# Altium footprint library ST封装.PcbLib: 1336 footprints (part 90 of 109)
Each footprint in its own frame and in the unit in brackets; x right, y up, seen from the top. Pads: shape width x height; smd on the part's side, far side on the other; paste and mask are expansions set on the pad; w line width, h text height; cw(c..) or ccw(c..) is an arc to the next point about the centre after c.
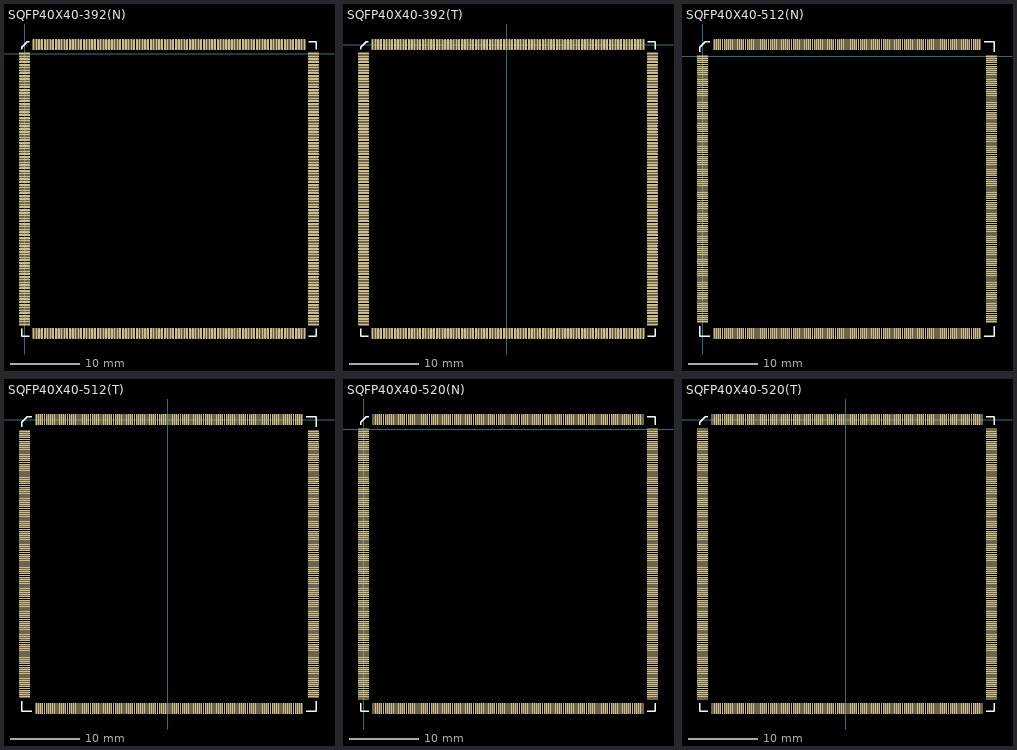
[diagram p89: the footprints below, top view; thin cyan lines are the x and y axes]

## SQFP40X40-392(N) [mm]
pads (392):
  rect 1.6x0.3 smd: 1(0,0)
  oval 1.6x0.3 smd: 2(0,-0.4) 3(0,-0.8) 4(0,-1.2) 5(0,-1.6) 6(0,-2) 7(0,-2.4) 8(0,-2.8) 9(0,-3.2) 10(0,-3.6) 11(0,-4) 12(0,-4.4) 13(0,-4.8) 14(0,-5.2) 15(0,-5.6) 16(0,-6) 17(0,-6.4) 18(0,-6.8) 19(0,-7.2) 20(0,-7.6) 21(0,-8) 22(0,-8.4) 23(0,-8.8) 24(0,-9.2) 25(0,-9.6) 26(0,-10) 27(0,-10.4) 28(0,-10.8) 29(0,-11.2) 30(0,-11.6) 31(0,-12) 32(0,-12.4) 33(0,-12.8) 34(0,-13.2) 35(0,-13.6) 36(0,-14) 37(0,-14.4) 38(0,-14.8) 39(0,-15.2) 40(0,-15.6) 41(0,-16) 42(0,-16.4) 43(0,-16.8) 44(0,-17.2) 45(0,-17.6) 46(0,-18) 47(0,-18.4) 48(0,-18.8) 49(0,-19.2) 50(0,-19.6) 51(0,-20) 52(0,-20.4) 53(0,-20.8) 54(0,-21.2) 55(0,-21.6) 56(0,-22) 57(0,-22.4) 58(0,-22.8) 59(0,-23.2) 60(0,-23.6) 61(0,-24) 62(0,-24.4) 63(0,-24.8) 64(0,-25.2) 65(0,-25.6) 66(0,-26) 67(0,-26.4) 68(0,-26.8) 69(0,-27.2) 70(0,-27.6) 71(0,-28) 72(0,-28.4) 73(0,-28.8) 74(0,-29.2) 75(0,-29.6) 76(0,-30) 77(0,-30.4) 78(0,-30.8) 79(0,-31.2) 80(0,-31.6) 81(0,-32) 82(0,-32.4) 83(0,-32.8) 84(0,-33.2) 85(0,-33.6) 86(0,-34) 87(0,-34.4) 88(0,-34.8) 89(0,-35.2) 90(0,-35.6) 91(0,-36) 92(0,-36.4) 93(0,-36.8) 94(0,-37.2) 95(0,-37.6) 96(0,-38) 97(0,-38.4) 98(0,-38.8) 197(41.4,-38.8) 198(41.4,-38.4) 199(41.4,-38) 200(41.4,-37.6) 201(41.4,-37.2) 202(41.4,-36.8) 203(41.4,-36.4) 204(41.4,-36) 205(41.4,-35.6) 206(41.4,-35.2) 207(41.4,-34.8) 208(41.4,-34.4) 209(41.4,-34) 210(41.4,-33.6) 211(41.4,-33.2) 212(41.4,-32.8) 213(41.4,-32.4) 214(41.4,-32) 215(41.4,-31.6) 216(41.4,-31.2) 217(41.4,-30.8) 218(41.4,-30.4) 219(41.4,-30) 220(41.4,-29.6) 221(41.4,-29.2) 222(41.4,-28.8) 223(41.4,-28.4) 224(41.4,-28) 225(41.4,-27.6) 226(41.4,-27.2) 227(41.4,-26.8) 228(41.4,-26.4) 229(41.4,-26) 230(41.4,-25.6) 231(41.4,-25.2) 232(41.4,-24.8) 233(41.4,-24.4) 234(41.4,-24) 235(41.4,-23.6) 236(41.4,-23.2) 237(41.4,-22.8) 238(41.4,-22.4) 239(41.4,-22) 240(41.4,-21.6) 241(41.4,-21.2) 242(41.4,-20.8) 243(41.4,-20.4) 244(41.4,-20) 245(41.4,-19.6) 246(41.4,-19.2) 247(41.4,-18.8) 248(41.4,-18.4) 249(41.4,-18) 250(41.4,-17.6) 251(41.4,-17.2) 252(41.4,-16.8) 253(41.4,-16.4) 254(41.4,-16) 255(41.4,-15.6) 256(41.4,-15.2) 257(41.4,-14.8) 258(41.4,-14.4) 259(41.4,-14) 260(41.4,-13.6) 261(41.4,-13.2) 262(41.4,-12.8) 263(41.4,-12.4) 264(41.4,-12) 265(41.4,-11.6) 266(41.4,-11.2) 267(41.4,-10.8) 268(41.4,-10.4) 269(41.4,-10) 270(41.4,-9.6) 271(41.4,-9.2) 272(41.4,-8.8) 273(41.4,-8.4) 274(41.4,-8) 275(41.4,-7.6) 276(41.4,-7.2) 277(41.4,-6.8) 278(41.4,-6.4) 279(41.4,-6) 280(41.4,-5.6) 281(41.4,-5.2) 282(41.4,-4.8) 283(41.4,-4.4) 284(41.4,-4) 285(41.4,-3.6) 286(41.4,-3.2) 287(41.4,-2.8) 288(41.4,-2.4) 289(41.4,-2) 290(41.4,-1.6) 291(41.4,-1.2) 292(41.4,-0.8) 293(41.4,-0.4) 294(41.4,0)
  oval 0.3x1.6 smd: 99(1.3,-40.1) 100(1.7,-40.1) 101(2.1,-40.1) 102(2.5,-40.1) 103(2.9,-40.1) 104(3.3,-40.1) 105(3.7,-40.1) 106(4.1,-40.1) 107(4.5,-40.1) 108(4.9,-40.1) 109(5.3,-40.1) 110(5.7,-40.1) 111(6.1,-40.1) 112(6.5,-40.1) 113(6.9,-40.1) 114(7.3,-40.1) 115(7.7,-40.1) 116(8.1,-40.1) 117(8.5,-40.1) 118(8.9,-40.1) 119(9.3,-40.1) 120(9.7,-40.1) 121(10.1,-40.1) 122(10.5,-40.1) 123(10.9,-40.1) 124(11.3,-40.1) 125(11.7,-40.1) 126(12.1,-40.1) 127(12.5,-40.1) 128(12.9,-40.1) 129(13.3,-40.1) 130(13.7,-40.1) 131(14.1,-40.1) 132(14.5,-40.1) 133(14.9,-40.1) 134(15.3,-40.1) 135(15.7,-40.1) 136(16.1,-40.1) 137(16.5,-40.1) 138(16.9,-40.1) 139(17.3,-40.1) 140(17.7,-40.1) 141(18.1,-40.1) 142(18.5,-40.1) 143(18.9,-40.1) 144(19.3,-40.1) 145(19.7,-40.1) 146(20.1,-40.1) 147(20.5,-40.1) 148(20.9,-40.1) 149(21.3,-40.1) 150(21.7,-40.1) 151(22.1,-40.1) 152(22.5,-40.1) 153(22.9,-40.1) 154(23.3,-40.1) 155(23.7,-40.1) 156(24.1,-40.1) 157(24.5,-40.1) 158(24.9,-40.1) 159(25.3,-40.1) 160(25.7,-40.1) 161(26.1,-40.1) 162(26.5,-40.1) 163(26.9,-40.1) 164(27.3,-40.1) 165(27.7,-40.1) 166(28.1,-40.1) 167(28.5,-40.1) 168(28.9,-40.1) 169(29.3,-40.1) 170(29.7,-40.1) 171(30.1,-40.1) 172(30.5,-40.1) 173(30.9,-40.1) 174(31.3,-40.1) 175(31.7,-40.1) 176(32.1,-40.1) 177(32.5,-40.1) 178(32.9,-40.1) 179(33.3,-40.1) 180(33.7,-40.1) 181(34.1,-40.1) 182(34.5,-40.1) 183(34.9,-40.1) 184(35.3,-40.1) 185(35.7,-40.1) 186(36.1,-40.1) 187(36.5,-40.1) 188(36.9,-40.1) 189(37.3,-40.1) 190(37.7,-40.1) 191(38.1,-40.1) 192(38.5,-40.1) 193(38.9,-40.1) 194(39.3,-40.1) 195(39.7,-40.1) 196(40.1,-40.1) 295(40.1,1.3) 296(39.7,1.3) 297(39.3,1.3) 298(38.9,1.3) 299(38.5,1.3) 300(38.1,1.3) 301(37.7,1.3) 302(37.3,1.3) 303(36.9,1.3) 304(36.5,1.3) 305(36.1,1.3) 306(35.7,1.3) 307(35.3,1.3) 308(34.9,1.3) 309(34.5,1.3) 310(34.1,1.3) 311(33.7,1.3) 312(33.3,1.3) 313(32.9,1.3) 314(32.5,1.3) 315(32.1,1.3) 316(31.7,1.3) 317(31.3,1.3) 318(30.9,1.3) 319(30.5,1.3) 320(30.1,1.3) 321(29.7,1.3) 322(29.3,1.3) 323(28.9,1.3) 324(28.5,1.3) 325(28.1,1.3) 326(27.7,1.3) 327(27.3,1.3) 328(26.9,1.3) 329(26.5,1.3) 330(26.1,1.3) 331(25.7,1.3) 332(25.3,1.3) 333(24.9,1.3) 334(24.5,1.3) 335(24.1,1.3) 336(23.7,1.3) 337(23.3,1.3) 338(22.9,1.3) 339(22.5,1.3) 340(22.1,1.3) 341(21.7,1.3) 342(21.3,1.3) 343(20.9,1.3) 344(20.5,1.3) 345(20.1,1.3) 346(19.7,1.3) 347(19.3,1.3) 348(18.9,1.3) 349(18.5,1.3) 350(18.1,1.3) 351(17.7,1.3) 352(17.3,1.3) 353(16.9,1.3) 354(16.5,1.3) 355(16.1,1.3) 356(15.7,1.3) 357(15.3,1.3) 358(14.9,1.3) 359(14.5,1.3) 360(14.1,1.3) 361(13.7,1.3) 362(13.3,1.3) 363(12.9,1.3) 364(12.5,1.3) 365(12.1,1.3) 366(11.7,1.3) 367(11.3,1.3) 368(10.9,1.3) 369(10.5,1.3) 370(10.1,1.3) 371(9.7,1.3) 372(9.3,1.3) 373(8.9,1.3) 374(8.5,1.3) 375(8.1,1.3) 376(7.7,1.3) 377(7.3,1.3) 378(6.9,1.3) 379(6.5,1.3) 380(6.1,1.3) 381(5.7,1.3) 382(5.3,1.3) 383(4.9,1.3) 384(4.5,1.3) 385(4.1,1.3) 386(3.7,1.3) 387(3.3,1.3) 388(2.9,1.3) 389(2.5,1.3) 390(2.1,1.3) 391(1.7,1.3) 392(1.3,1.3)
Top Overlay:
  lines w0.2: -0.4,-39.45 -0.4,-40.5 0.65,-40.5 ; -0.4,0.65 -0.4,0.9 0.4,1.7 0.65,1.7 ; 40.75,-40.5 41.8,-40.5 41.8,-39.45 ; 40.75,1.7 41.8,1.7 41.8,0.65

## SQFP40X40-392(T) [mm]
pads (392):
  rect 0.3x1.6 smd: 1(0,0)
  oval 0.3x1.6 smd: 2(-0.4,0) 3(-0.8,0) 4(-1.2,0) 5(-1.6,0) 6(-2,0) 7(-2.4,0) 8(-2.8,0) 9(-3.2,0) 10(-3.6,0) 11(-4,0) 12(-4.4,0) 13(-4.8,0) 14(-5.2,0) 15(-5.6,0) 16(-6,0) 17(-6.4,0) 18(-6.8,0) 19(-7.2,0) 20(-7.6,0) 21(-8,0) 22(-8.4,0) 23(-8.8,0) 24(-9.2,0) 25(-9.6,0) 26(-10,0) 27(-10.4,0) 28(-10.8,0) 29(-11.2,0) 30(-11.6,0) 31(-12,0) 32(-12.4,0) 33(-12.8,0) 34(-13.2,0) 35(-13.6,0) 36(-14,0) 37(-14.4,0) 38(-14.8,0) 39(-15.2,0) 40(-15.6,0) 41(-16,0) 42(-16.4,0) 43(-16.8,0) 44(-17.2,0) 45(-17.6,0) 46(-18,0) 47(-18.4,0) 48(-18.8,0) 49(-19.2,0) 148(-19.2,-41.4) 149(-18.8,-41.4) 150(-18.4,-41.4) 151(-18,-41.4) 152(-17.6,-41.4) 153(-17.2,-41.4) 154(-16.8,-41.4) 155(-16.4,-41.4) 156(-16,-41.4) 157(-15.6,-41.4) 158(-15.2,-41.4) 159(-14.8,-41.4) 160(-14.4,-41.4) 161(-14,-41.4) 162(-13.6,-41.4) 163(-13.2,-41.4) 164(-12.8,-41.4) 165(-12.4,-41.4) 166(-12,-41.4) 167(-11.6,-41.4) 168(-11.2,-41.4) 169(-10.8,-41.4) 170(-10.4,-41.4) 171(-10,-41.4) 172(-9.6,-41.4) 173(-9.2,-41.4) 174(-8.8,-41.4) 175(-8.4,-41.4) 176(-8,-41.4) 177(-7.6,-41.4) 178(-7.2,-41.4) 179(-6.8,-41.4) 180(-6.4,-41.4) 181(-6,-41.4) 182(-5.6,-41.4) 183(-5.2,-41.4) 184(-4.8,-41.4) 185(-4.4,-41.4) 186(-4,-41.4) 187(-3.6,-41.4) 188(-3.2,-41.4) 189(-2.8,-41.4) 190(-2.4,-41.4) 191(-2,-41.4) 192(-1.6,-41.4) 193(-1.2,-41.4) 194(-0.8,-41.4) 195(-0.4,-41.4) 196(0,-41.4) 197(0.4,-41.4) 198(0.8,-41.4) 199(1.2,-41.4) 200(1.6,-41.4) 201(2,-41.4) 202(2.4,-41.4) 203(2.8,-41.4) 204(3.2,-41.4) 205(3.6,-41.4) 206(4,-41.4) 207(4.4,-41.4) 208(4.8,-41.4) 209(5.2,-41.4) 210(5.6,-41.4) 211(6,-41.4) 212(6.4,-41.4) 213(6.8,-41.4) 214(7.2,-41.4) 215(7.6,-41.4) 216(8,-41.4) 217(8.4,-41.4) 218(8.8,-41.4) 219(9.2,-41.4) 220(9.6,-41.4) 221(10,-41.4) 222(10.4,-41.4) 223(10.8,-41.4) 224(11.2,-41.4) 225(11.6,-41.4) 226(12,-41.4) 227(12.4,-41.4) 228(12.8,-41.4) 229(13.2,-41.4) 230(13.6,-41.4) 231(14,-41.4) 232(14.4,-41.4) 233(14.8,-41.4) 234(15.2,-41.4) 235(15.6,-41.4) 236(16,-41.4) 237(16.4,-41.4) 238(16.8,-41.4) 239(17.2,-41.4) 240(17.6,-41.4) 241(18,-41.4) 242(18.4,-41.4) 243(18.8,-41.4) 244(19.2,-41.4) 245(19.6,-41.4) 344(19.6,0) 345(19.2,0) 346(18.8,0) 347(18.4,0) 348(18,0) 349(17.6,0) 350(17.2,0) 351(16.8,0) 352(16.4,0) 353(16,0) 354(15.6,0) 355(15.2,0) 356(14.8,0) 357(14.4,0) 358(14,0) 359(13.6,0) 360(13.2,0) 361(12.8,0) 362(12.4,0) 363(12,0) 364(11.6,0) 365(11.2,0) 366(10.8,0) 367(10.4,0) 368(10,0) 369(9.6,0) 370(9.2,0) 371(8.8,0) 372(8.4,0) 373(8,0) 374(7.6,0) 375(7.2,0) 376(6.8,0) 377(6.4,0) 378(6,0) 379(5.6,0) 380(5.2,0) 381(4.8,0) 382(4.4,0) 383(4,0) 384(3.6,0) 385(3.2,0) 386(2.8,0) 387(2.4,0) 388(2,0) 389(1.6,0) 390(1.2,0) 391(0.8,0) 392(0.4,0)
  oval 1.6x0.3 smd: 50(-20.5,-1.3) 51(-20.5,-1.7) 52(-20.5,-2.1) 53(-20.5,-2.5) 54(-20.5,-2.9) 55(-20.5,-3.3) 56(-20.5,-3.7) 57(-20.5,-4.1) 58(-20.5,-4.5) 59(-20.5,-4.9) 60(-20.5,-5.3) 61(-20.5,-5.7) 62(-20.5,-6.1) 63(-20.5,-6.5) 64(-20.5,-6.9) 65(-20.5,-7.3) 66(-20.5,-7.7) 67(-20.5,-8.1) 68(-20.5,-8.5) 69(-20.5,-8.9) 70(-20.5,-9.3) 71(-20.5,-9.7) 72(-20.5,-10.1) 73(-20.5,-10.5) 74(-20.5,-10.9) 75(-20.5,-11.3) 76(-20.5,-11.7) 77(-20.5,-12.1) 78(-20.5,-12.5) 79(-20.5,-12.9) 80(-20.5,-13.3) 81(-20.5,-13.7) 82(-20.5,-14.1) 83(-20.5,-14.5) 84(-20.5,-14.9) 85(-20.5,-15.3) 86(-20.5,-15.7) 87(-20.5,-16.1) 88(-20.5,-16.5) 89(-20.5,-16.9) 90(-20.5,-17.3) 91(-20.5,-17.7) 92(-20.5,-18.1) 93(-20.5,-18.5) 94(-20.5,-18.9) 95(-20.5,-19.3) 96(-20.5,-19.7) 97(-20.5,-20.1) 98(-20.5,-20.5) 99(-20.5,-20.9) 100(-20.5,-21.3) 101(-20.5,-21.7) 102(-20.5,-22.1) 103(-20.5,-22.5) 104(-20.5,-22.9) 105(-20.5,-23.3) 106(-20.5,-23.7) 107(-20.5,-24.1) 108(-20.5,-24.5) 109(-20.5,-24.9) 110(-20.5,-25.3) 111(-20.5,-25.7) 112(-20.5,-26.1) 113(-20.5,-26.5) 114(-20.5,-26.9) 115(-20.5,-27.3) 116(-20.5,-27.7) 117(-20.5,-28.1) 118(-20.5,-28.5) 119(-20.5,-28.9) 120(-20.5,-29.3) 121(-20.5,-29.7) 122(-20.5,-30.1) 123(-20.5,-30.5) 124(-20.5,-30.9) 125(-20.5,-31.3) 126(-20.5,-31.7) 127(-20.5,-32.1) 128(-20.5,-32.5) 129(-20.5,-32.9) 130(-20.5,-33.3) 131(-20.5,-33.7) 132(-20.5,-34.1) 133(-20.5,-34.5) 134(-20.5,-34.9) 135(-20.5,-35.3) 136(-20.5,-35.7) 137(-20.5,-36.1) 138(-20.5,-36.5) 139(-20.5,-36.9) 140(-20.5,-37.3) 141(-20.5,-37.7) 142(-20.5,-38.1) 143(-20.5,-38.5) 144(-20.5,-38.9) 145(-20.5,-39.3) 146(-20.5,-39.7) 147(-20.5,-40.1) 246(20.9,-40.1) 247(20.9,-39.7) 248(20.9,-39.3) 249(20.9,-38.9) 250(20.9,-38.5) 251(20.9,-38.1) 252(20.9,-37.7) 253(20.9,-37.3) 254(20.9,-36.9) 255(20.9,-36.5) 256(20.9,-36.1) 257(20.9,-35.7) 258(20.9,-35.3) 259(20.9,-34.9) 260(20.9,-34.5) 261(20.9,-34.1) 262(20.9,-33.7) 263(20.9,-33.3) 264(20.9,-32.9) 265(20.9,-32.5) 266(20.9,-32.1) 267(20.9,-31.7) 268(20.9,-31.3) 269(20.9,-30.9) 270(20.9,-30.5) 271(20.9,-30.1) 272(20.9,-29.7) 273(20.9,-29.3) 274(20.9,-28.9) 275(20.9,-28.5) 276(20.9,-28.1) 277(20.9,-27.7) 278(20.9,-27.3) 279(20.9,-26.9) 280(20.9,-26.5) 281(20.9,-26.1) 282(20.9,-25.7) 283(20.9,-25.3) 284(20.9,-24.9) 285(20.9,-24.5) 286(20.9,-24.1) 287(20.9,-23.7) 288(20.9,-23.3) 289(20.9,-22.9) 290(20.9,-22.5) 291(20.9,-22.1) 292(20.9,-21.7) 293(20.9,-21.3) 294(20.9,-20.9) 295(20.9,-20.5) 296(20.9,-20.1) 297(20.9,-19.7) 298(20.9,-19.3) 299(20.9,-18.9) 300(20.9,-18.5) 301(20.9,-18.1) 302(20.9,-17.7) 303(20.9,-17.3) 304(20.9,-16.9) 305(20.9,-16.5) 306(20.9,-16.1) 307(20.9,-15.7) 308(20.9,-15.3) 309(20.9,-14.9) 310(20.9,-14.5) 311(20.9,-14.1) 312(20.9,-13.7) 313(20.9,-13.3) 314(20.9,-12.9) 315(20.9,-12.5) 316(20.9,-12.1) 317(20.9,-11.7) 318(20.9,-11.3) 319(20.9,-10.9) 320(20.9,-10.5) 321(20.9,-10.1) 322(20.9,-9.7) 323(20.9,-9.3) 324(20.9,-8.9) 325(20.9,-8.5) 326(20.9,-8.1) 327(20.9,-7.7) 328(20.9,-7.3) 329(20.9,-6.9) 330(20.9,-6.5) 331(20.9,-6.1) 332(20.9,-5.7) 333(20.9,-5.3) 334(20.9,-4.9) 335(20.9,-4.5) 336(20.9,-4.1) 337(20.9,-3.7) 338(20.9,-3.3) 339(20.9,-2.9) 340(20.9,-2.5) 341(20.9,-2.1) 342(20.9,-1.7) 343(20.9,-1.3)
Top Overlay:
  lines w0.2: -20.9,-40.75 -20.9,-41.8 -19.85,-41.8 ; -20.9,-0.65 -20.9,-0.4 -20.1,0.4 -19.85,0.4 ; 20.25,-41.8 21.3,-41.8 21.3,-40.75 ; 20.25,0.4 21.3,0.4 21.3,-0.65

## SQFP40X40-512(N) [mm]
pads (512):
  rect 1.6x0.2 smd: 1(0,0)
  oval 1.6x0.2 smd: 2(0,-0.3) 3(0,-0.6) 4(0,-0.9) 5(0,-1.2) 6(0,-1.5) 7(0,-1.8) 8(0,-2.1) 9(0,-2.4) 10(0,-2.7) 11(0,-3) 12(0,-3.3) 13(0,-3.6) 14(0,-3.9) 15(0,-4.2) 16(0,-4.5) 17(0,-4.8) 18(0,-5.1) 19(0,-5.4) 20(0,-5.7) 21(0,-6) 22(0,-6.3) 23(0,-6.6) 24(0,-6.9) 25(0,-7.2) 26(0,-7.5) 27(0,-7.8) 28(0,-8.1) 29(0,-8.4) 30(0,-8.7) 31(0,-9) 32(0,-9.3) 33(0,-9.6) 34(0,-9.9) 35(0,-10.2) 36(0,-10.5) 37(0,-10.8) 38(0,-11.1) 39(0,-11.4) 40(0,-11.7) 41(0,-12) 42(0,-12.3) 43(0,-12.6) 44(0,-12.9) 45(0,-13.2) 46(0,-13.5) 47(0,-13.8) 48(0,-14.1) 49(0,-14.4) 50(0,-14.7) 51(0,-15) 52(0,-15.3) 53(0,-15.6) 54(0,-15.9) 55(0,-16.2) 56(0,-16.5) 57(0,-16.8) 58(0,-17.1) 59(0,-17.4) 60(0,-17.7) 61(0,-18) 62(0,-18.3) 63(0,-18.6) 64(0,-18.9) 65(0,-19.2) 66(0,-19.5) 67(0,-19.8) 68(0,-20.1) 69(0,-20.4) 70(0,-20.7) 71(0,-21) 72(0,-21.3) 73(0,-21.6) 74(0,-21.9) 75(0,-22.2) 76(0,-22.5) 77(0,-22.8) 78(0,-23.1) 79(0,-23.4) 80(0,-23.7) 81(0,-24) 82(0,-24.3) 83(0,-24.6) 84(0,-24.9) 85(0,-25.2) 86(0,-25.5) 87(0,-25.8) 88(0,-26.1) 89(0,-26.4) 90(0,-26.7) 91(0,-27) 92(0,-27.3) 93(0,-27.6) 94(0,-27.9) 95(0,-28.2) 96(0,-28.5) 97(0,-28.8) 98(0,-29.1) 99(0,-29.4) 100(0,-29.7) 101(0,-30) 102(0,-30.3) 103(0,-30.6) 104(0,-30.9) 105(0,-31.2) 106(0,-31.5) 107(0,-31.8) 108(0,-32.1) 109(0,-32.4) 110(0,-32.7) 111(0,-33) 112(0,-33.3) 113(0,-33.6) 114(0,-33.9) 115(0,-34.2) 116(0,-34.5) 117(0,-34.8) 118(0,-35.1) 119(0,-35.4) 120(0,-35.7) 121(0,-36) 122(0,-36.3) 123(0,-36.6) 124(0,-36.9) 125(0,-37.2) 126(0,-37.5) 127(0,-37.8) 128(0,-38.1) 257(41.4,-38.1) 258(41.4,-37.8) 259(41.4,-37.5) 260(41.4,-37.2) 261(41.4,-36.9) 262(41.4,-36.6) 263(41.4,-36.3) 264(41.4,-36) 265(41.4,-35.7) 266(41.4,-35.4) 267(41.4,-35.1) 268(41.4,-34.8) 269(41.4,-34.5) 270(41.4,-34.2) 271(41.4,-33.9) 272(41.4,-33.6) 273(41.4,-33.3) 274(41.4,-33) 275(41.4,-32.7) 276(41.4,-32.4) 277(41.4,-32.1) 278(41.4,-31.8) 279(41.4,-31.5) 280(41.4,-31.2) 281(41.4,-30.9) 282(41.4,-30.6) 283(41.4,-30.3) 284(41.4,-30) 285(41.4,-29.7) 286(41.4,-29.4) 287(41.4,-29.1) 288(41.4,-28.8) 289(41.4,-28.5) 290(41.4,-28.2) 291(41.4,-27.9) 292(41.4,-27.6) 293(41.4,-27.3) 294(41.4,-27) 295(41.4,-26.7) 296(41.4,-26.4) 297(41.4,-26.1) 298(41.4,-25.8) 299(41.4,-25.5) 300(41.4,-25.2) 301(41.4,-24.9) 302(41.4,-24.6) 303(41.4,-24.3) 304(41.4,-24) 305(41.4,-23.7) 306(41.4,-23.4) 307(41.4,-23.1) 308(41.4,-22.8) 309(41.4,-22.5) 310(41.4,-22.2) 311(41.4,-21.9) 312(41.4,-21.6) 313(41.4,-21.3) 314(41.4,-21) 315(41.4,-20.7) 316(41.4,-20.4) 317(41.4,-20.1) 318(41.4,-19.8) 319(41.4,-19.5) 320(41.4,-19.2) 321(41.4,-18.9) 322(41.4,-18.6) 323(41.4,-18.3) 324(41.4,-18) 325(41.4,-17.7) 326(41.4,-17.4) 327(41.4,-17.1) 328(41.4,-16.8) 329(41.4,-16.5) 330(41.4,-16.2) 331(41.4,-15.9) 332(41.4,-15.6) 333(41.4,-15.3) 334(41.4,-15) 335(41.4,-14.7) 336(41.4,-14.4) 337(41.4,-14.1) 338(41.4,-13.8) 339(41.4,-13.5) 340(41.4,-13.2) 341(41.4,-12.9) 342(41.4,-12.6) 343(41.4,-12.3) 344(41.4,-12) 345(41.4,-11.7) 346(41.4,-11.4) 347(41.4,-11.1) 348(41.4,-10.8) 349(41.4,-10.5) 350(41.4,-10.2) 351(41.4,-9.9) 352(41.4,-9.6) 353(41.4,-9.3) 354(41.4,-9) 355(41.4,-8.7) 356(41.4,-8.4) 357(41.4,-8.1) 358(41.4,-7.8) 359(41.4,-7.5) 360(41.4,-7.2) 361(41.4,-6.9) 362(41.4,-6.6) 363(41.4,-6.3) 364(41.4,-6) 365(41.4,-5.7) 366(41.4,-5.4) 367(41.4,-5.1) 368(41.4,-4.8) 369(41.4,-4.5) 370(41.4,-4.2) 371(41.4,-3.9) 372(41.4,-3.6) 373(41.4,-3.3) 374(41.4,-3) 375(41.4,-2.7) 376(41.4,-2.4) 377(41.4,-2.1) 378(41.4,-1.8) 379(41.4,-1.5) 380(41.4,-1.2) 381(41.4,-0.9) 382(41.4,-0.6) 383(41.4,-0.3) 384(41.4,0)
  oval 0.2x1.6 smd: 129(1.65,-39.75) 130(1.95,-39.75) 131(2.25,-39.75) 132(2.55,-39.75) 133(2.85,-39.75) 134(3.15,-39.75) 135(3.45,-39.75) 136(3.75,-39.75) 137(4.05,-39.75) 138(4.35,-39.75) 139(4.65,-39.75) 140(4.95,-39.75) 141(5.25,-39.75) 142(5.55,-39.75) 143(5.85,-39.75) 144(6.15,-39.75) 145(6.45,-39.75) 146(6.75,-39.75) 147(7.05,-39.75) 148(7.35,-39.75) 149(7.65,-39.75) 150(7.95,-39.75) 151(8.25,-39.75) 152(8.55,-39.75) 153(8.85,-39.75) 154(9.15,-39.75) 155(9.45,-39.75) 156(9.75,-39.75) 157(10.05,-39.75) 158(10.35,-39.75) 159(10.65,-39.75) 160(10.95,-39.75) 161(11.25,-39.75) 162(11.55,-39.75) 163(11.85,-39.75) 164(12.15,-39.75) 165(12.45,-39.75) 166(12.75,-39.75) 167(13.05,-39.75) 168(13.35,-39.75) 169(13.65,-39.75) 170(13.95,-39.75) 171(14.25,-39.75) 172(14.55,-39.75) 173(14.85,-39.75) 174(15.15,-39.75) 175(15.45,-39.75) 176(15.75,-39.75) 177(16.05,-39.75) 178(16.35,-39.75) 179(16.65,-39.75) 180(16.95,-39.75) 181(17.25,-39.75) 182(17.55,-39.75) 183(17.85,-39.75) 184(18.15,-39.75) 185(18.45,-39.75) 186(18.75,-39.75) 187(19.05,-39.75) 188(19.35,-39.75) 189(19.65,-39.75) 190(19.95,-39.75) 191(20.25,-39.75) 192(20.55,-39.75) 193(20.85,-39.75) 194(21.15,-39.75) 195(21.45,-39.75) 196(21.75,-39.75) 197(22.05,-39.75) 198(22.35,-39.75) 199(22.65,-39.75) 200(22.95,-39.75) 201(23.25,-39.75) 202(23.55,-39.75) 203(23.85,-39.75) 204(24.15,-39.75) 205(24.45,-39.75) 206(24.75,-39.75) 207(25.05,-39.75) 208(25.35,-39.75) 209(25.65,-39.75) 210(25.95,-39.75) 211(26.25,-39.75) 212(26.55,-39.75) 213(26.85,-39.75) 214(27.15,-39.75) 215(27.45,-39.75) 216(27.75,-39.75) 217(28.05,-39.75) 218(28.35,-39.75) 219(28.65,-39.75) 220(28.95,-39.75) 221(29.25,-39.75) 222(29.55,-39.75) 223(29.85,-39.75) 224(30.15,-39.75) 225(30.45,-39.75) 226(30.75,-39.75) 227(31.05,-39.75) 228(31.35,-39.75) 229(31.65,-39.75) 230(31.95,-39.75) 231(32.25,-39.75) 232(32.55,-39.75) 233(32.85,-39.75) 234(33.15,-39.75) 235(33.45,-39.75) 236(33.75,-39.75) 237(34.05,-39.75) 238(34.35,-39.75) 239(34.65,-39.75) 240(34.95,-39.75) 241(35.25,-39.75) 242(35.55,-39.75) 243(35.85,-39.75) 244(36.15,-39.75) 245(36.45,-39.75) 246(36.75,-39.75) 247(37.05,-39.75) 248(37.35,-39.75) 249(37.65,-39.75) 250(37.95,-39.75) 251(38.25,-39.75) 252(38.55,-39.75) 253(38.85,-39.75) 254(39.15,-39.75) 255(39.45,-39.75) 256(39.75,-39.75) 385(39.75,1.65) 386(39.45,1.65) 387(39.15,1.65) 388(38.85,1.65) 389(38.55,1.65) 390(38.25,1.65) 391(37.95,1.65) 392(37.65,1.65) 393(37.35,1.65) 394(37.05,1.65) 395(36.75,1.65) 396(36.45,1.65) 397(36.15,1.65) 398(35.85,1.65) 399(35.55,1.65) 400(35.25,1.65) 401(34.95,1.65) 402(34.65,1.65) 403(34.35,1.65) 404(34.05,1.65) 405(33.75,1.65) 406(33.45,1.65) 407(33.15,1.65) 408(32.85,1.65) 409(32.55,1.65) 410(32.25,1.65) 411(31.95,1.65) 412(31.65,1.65) 413(31.35,1.65) 414(31.05,1.65) 415(30.75,1.65) 416(30.45,1.65) 417(30.15,1.65) 418(29.85,1.65) 419(29.55,1.65) 420(29.25,1.65) 421(28.95,1.65) 422(28.65,1.65) 423(28.35,1.65) 424(28.05,1.65) 425(27.75,1.65) 426(27.45,1.65) 427(27.15,1.65) 428(26.85,1.65) 429(26.55,1.65) 430(26.25,1.65) 431(25.95,1.65) 432(25.65,1.65) 433(25.35,1.65) 434(25.05,1.65) 435(24.75,1.65) 436(24.45,1.65) 437(24.15,1.65) 438(23.85,1.65) 439(23.55,1.65) 440(23.25,1.65) 441(22.95,1.65) 442(22.65,1.65) 443(22.35,1.65) 444(22.05,1.65) 445(21.75,1.65) 446(21.45,1.65) 447(21.15,1.65) 448(20.85,1.65) 449(20.55,1.65) 450(20.25,1.65) 451(19.95,1.65) 452(19.65,1.65) 453(19.35,1.65) 454(19.05,1.65) 455(18.75,1.65) 456(18.45,1.65) 457(18.15,1.65) 458(17.85,1.65) 459(17.55,1.65) 460(17.25,1.65) 461(16.95,1.65) 462(16.65,1.65) 463(16.35,1.65) 464(16.05,1.65) 465(15.75,1.65) 466(15.45,1.65) 467(15.15,1.65) 468(14.85,1.65) 469(14.55,1.65) 470(14.25,1.65) 471(13.95,1.65) 472(13.65,1.65) 473(13.35,1.65) 474(13.05,1.65) 475(12.75,1.65) 476(12.45,1.65) 477(12.15,1.65) 478(11.85,1.65) 479(11.55,1.65) 480(11.25,1.65) 481(10.95,1.65) 482(10.65,1.65) 483(10.35,1.65) 484(10.05,1.65) 485(9.75,1.65) 486(9.45,1.65) 487(9.15,1.65) 488(8.85,1.65) 489(8.55,1.65) 490(8.25,1.65) 491(7.95,1.65) 492(7.65,1.65) 493(7.35,1.65) 494(7.05,1.65) 495(6.75,1.65) 496(6.45,1.65) 497(6.15,1.65) 498(5.85,1.65) 499(5.55,1.65) 500(5.25,1.65) 501(4.95,1.65) 502(4.65,1.65) 503(4.35,1.65) 504(4.05,1.65) 505(3.75,1.65) 506(3.45,1.65) 507(3.15,1.65) 508(2.85,1.65) 509(2.55,1.65) 510(2.25,1.65) 511(1.95,1.65) 512(1.65,1.65)
Top Overlay:
  lines w0.2: -0.4,-38.7 -0.4,-40.15 1.05,-40.15 ; -0.4,0.6 -0.4,1.25 0.4,2.05 1.05,2.05 ; 40.35,-40.15 41.8,-40.15 41.8,-38.7 ; 40.35,2.05 41.8,2.05 41.8,0.6

## SQFP40X40-512(T) [mm]
pads (512):
  rect 0.2x1.6 smd: 1(0,0)
  oval 0.2x1.6 smd: 2(-0.3,0) 3(-0.6,0) 4(-0.9,0) 5(-1.2,0) 6(-1.5,0) 7(-1.8,0) 8(-2.1,0) 9(-2.4,0) 10(-2.7,0) 11(-3,0) 12(-3.3,0) 13(-3.6,0) 14(-3.9,0) 15(-4.2,0) 16(-4.5,0) 17(-4.8,0) 18(-5.1,0) 19(-5.4,0) 20(-5.7,0) 21(-6,0) 22(-6.3,0) 23(-6.6,0) 24(-6.9,0) 25(-7.2,0) 26(-7.5,0) 27(-7.8,0) 28(-8.1,0) 29(-8.4,0) 30(-8.7,0) 31(-9,0) 32(-9.3,0) 33(-9.6,0) 34(-9.9,0) 35(-10.2,0) 36(-10.5,0) 37(-10.8,0) 38(-11.1,0) 39(-11.4,0) 40(-11.7,0) 41(-12,0) 42(-12.3,0) 43(-12.6,0) 44(-12.9,0) 45(-13.2,0) 46(-13.5,0) 47(-13.8,0) 48(-14.1,0) 49(-14.4,0) 50(-14.7,0) 51(-15,0) 52(-15.3,0) 53(-15.6,0) 54(-15.9,0) 55(-16.2,0) 56(-16.5,0) 57(-16.8,0) 58(-17.1,0) 59(-17.4,0) 60(-17.7,0) 61(-18,0) 62(-18.3,0) 63(-18.6,0) 64(-18.9,0) 193(-18.9,-41.4) 194(-18.6,-41.4) 195(-18.3,-41.4) 196(-18,-41.4) 197(-17.7,-41.4) 198(-17.4,-41.4) 199(-17.1,-41.4) 200(-16.8,-41.4) 201(-16.5,-41.4) 202(-16.2,-41.4) 203(-15.9,-41.4) 204(-15.6,-41.4) 205(-15.3,-41.4) 206(-15,-41.4) 207(-14.7,-41.4) 208(-14.4,-41.4) 209(-14.1,-41.4) 210(-13.8,-41.4) 211(-13.5,-41.4) 212(-13.2,-41.4) 213(-12.9,-41.4) 214(-12.6,-41.4) 215(-12.3,-41.4) 216(-12,-41.4) 217(-11.7,-41.4) 218(-11.4,-41.4) 219(-11.1,-41.4) 220(-10.8,-41.4) 221(-10.5,-41.4) 222(-10.2,-41.4) 223(-9.9,-41.4) 224(-9.6,-41.4) 225(-9.3,-41.4) 226(-9,-41.4) 227(-8.7,-41.4) 228(-8.4,-41.4) 229(-8.1,-41.4) 230(-7.8,-41.4) 231(-7.5,-41.4) 232(-7.2,-41.4) 233(-6.9,-41.4) 234(-6.6,-41.4) 235(-6.3,-41.4) 236(-6,-41.4) 237(-5.7,-41.4) 238(-5.4,-41.4) 239(-5.1,-41.4) 240(-4.8,-41.4) 241(-4.5,-41.4) 242(-4.2,-41.4) 243(-3.9,-41.4) 244(-3.6,-41.4) 245(-3.3,-41.4) 246(-3,-41.4) 247(-2.7,-41.4) 248(-2.4,-41.4) 249(-2.1,-41.4) 250(-1.8,-41.4) 251(-1.5,-41.4) 252(-1.2,-41.4) 253(-0.9,-41.4) 254(-0.6,-41.4) 255(-0.3,-41.4) 256(0,-41.4) 257(0.3,-41.4) 258(0.6,-41.4) 259(0.9,-41.4) 260(1.2,-41.4) 261(1.5,-41.4) 262(1.8,-41.4) 263(2.1,-41.4) 264(2.4,-41.4) 265(2.7,-41.4) 266(3,-41.4) 267(3.3,-41.4) 268(3.6,-41.4) 269(3.9,-41.4) 270(4.2,-41.4) 271(4.5,-41.4) 272(4.8,-41.4) 273(5.1,-41.4) 274(5.4,-41.4) 275(5.7,-41.4) 276(6,-41.4) 277(6.3,-41.4) 278(6.6,-41.4) 279(6.9,-41.4) 280(7.2,-41.4) 281(7.5,-41.4) 282(7.8,-41.4) 283(8.1,-41.4) 284(8.4,-41.4) 285(8.7,-41.4) 286(9,-41.4) 287(9.3,-41.4) 288(9.6,-41.4) 289(9.9,-41.4) 290(10.2,-41.4) 291(10.5,-41.4) 292(10.8,-41.4) 293(11.1,-41.4) 294(11.4,-41.4) 295(11.7,-41.4) 296(12,-41.4) 297(12.3,-41.4) 298(12.6,-41.4) 299(12.9,-41.4) 300(13.2,-41.4) 301(13.5,-41.4) 302(13.8,-41.4) 303(14.1,-41.4) 304(14.4,-41.4) 305(14.7,-41.4) 306(15,-41.4) 307(15.3,-41.4) 308(15.6,-41.4) 309(15.9,-41.4) 310(16.2,-41.4) 311(16.5,-41.4) 312(16.8,-41.4) 313(17.1,-41.4) 314(17.4,-41.4) 315(17.7,-41.4) 316(18,-41.4) 317(18.3,-41.4) 318(18.6,-41.4) 319(18.9,-41.4) 320(19.2,-41.4) 449(19.2,0) 450(18.9,0) 451(18.6,0) 452(18.3,0) 453(18,0) 454(17.7,0) 455(17.4,0) 456(17.1,0) 457(16.8,0) 458(16.5,0) 459(16.2,0) 460(15.9,0) 461(15.6,0) 462(15.3,0) 463(15,0) 464(14.7,0) 465(14.4,0) 466(14.1,0) 467(13.8,0) 468(13.5,0) 469(13.2,0) 470(12.9,0) 471(12.6,0) 472(12.3,0) 473(12,0) 474(11.7,0) 475(11.4,0) 476(11.1,0) 477(10.8,0) 478(10.5,0) 479(10.2,0) 480(9.9,0) 481(9.6,0) 482(9.3,0) 483(9,0) 484(8.7,0) 485(8.4,0) 486(8.1,0) 487(7.8,0) 488(7.5,0) 489(7.2,0) 490(6.9,0) 491(6.6,0) 492(6.3,0) 493(6,0) 494(5.7,0) 495(5.4,0) 496(5.1,0) 497(4.8,0) 498(4.5,0) 499(4.2,0) 500(3.9,0) 501(3.6,0) 502(3.3,0) 503(3,0) 504(2.7,0) 505(2.4,0) 506(2.1,0) 507(1.8,0) 508(1.5,0) 509(1.2,0) 510(0.9,0) 511(0.6,0) 512(0.3,0)